# Altium footprint library Austindetz_CM4_Board_v1.0.PcbLib: 102 footprints (part 2 of 7)
Each footprint in its own frame and in the unit in brackets; x right, y up, seen from the top. Pads: shape width x height; smd on the part's side, far side on the other; paste and mask are expansions set on the pad; w line width, h text height; cw(c..) or ccw(c..) is an arc to the next point about the centre after c.
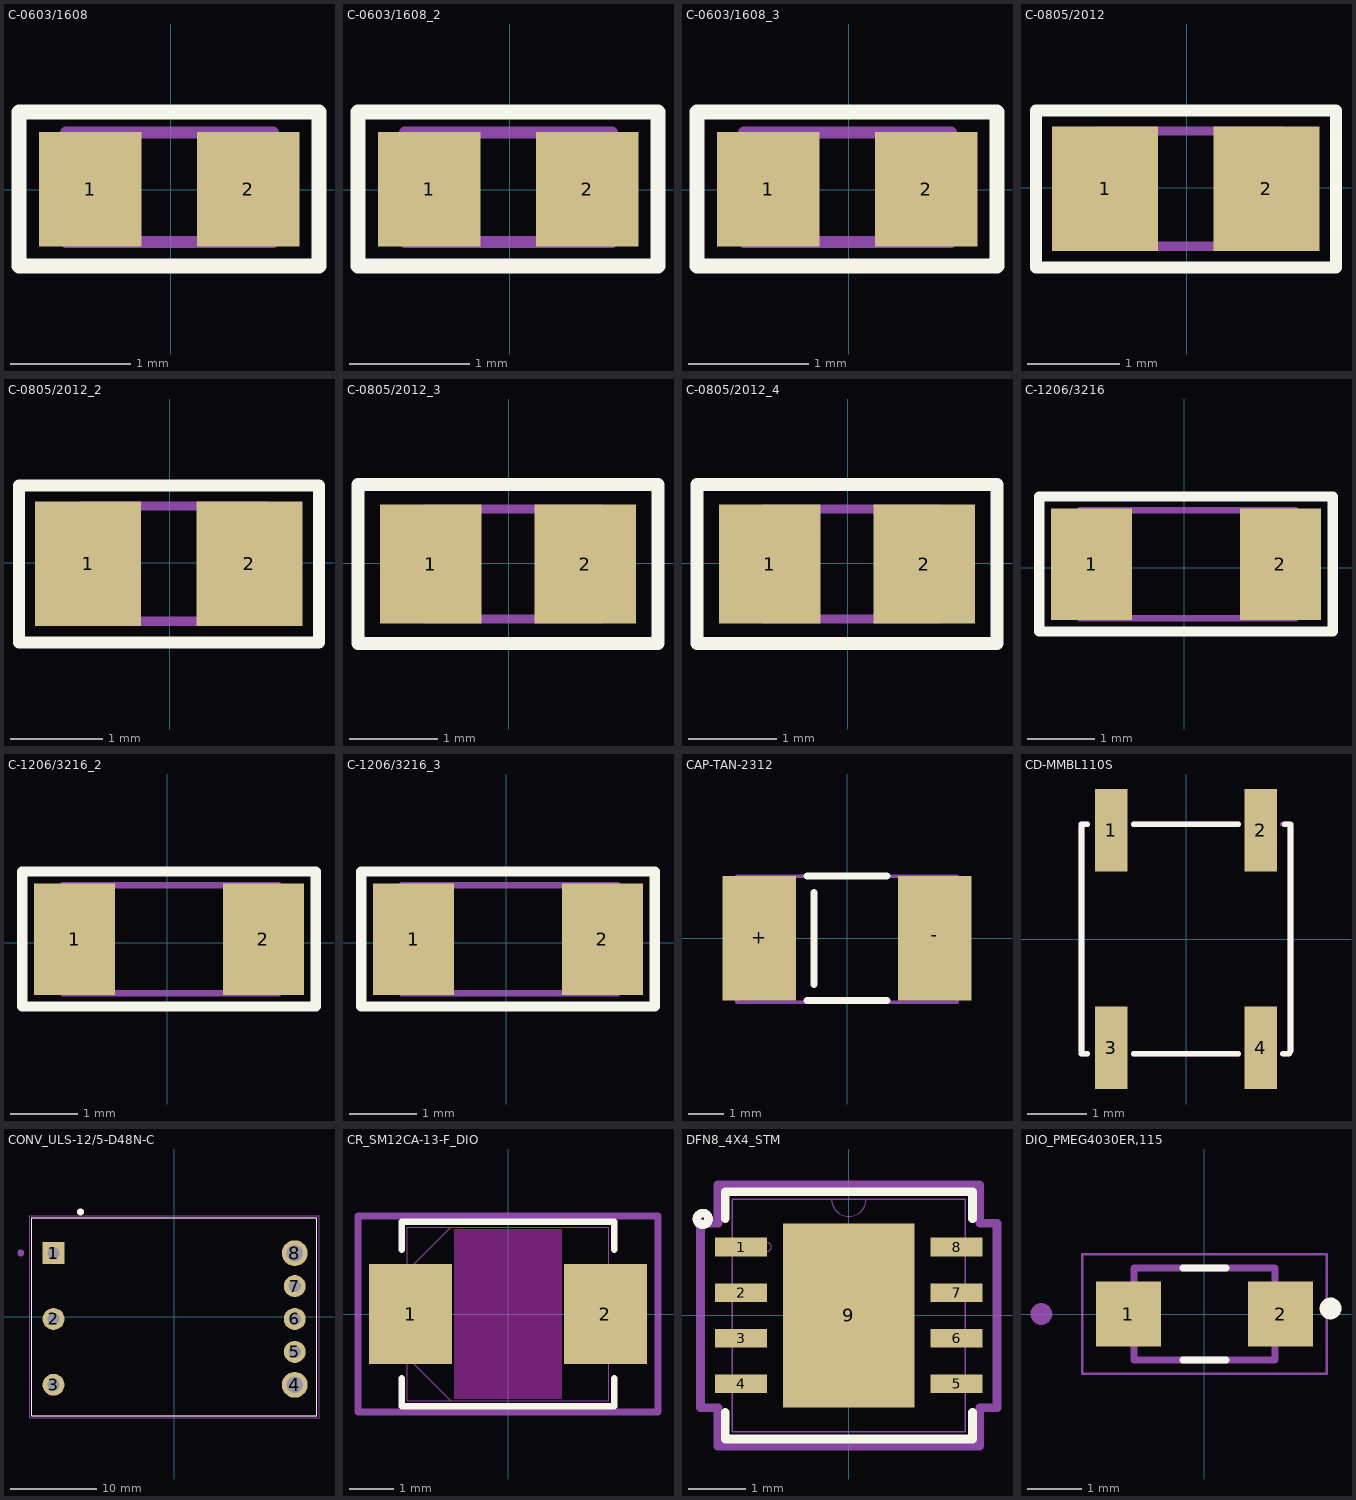
[diagram p1: the footprints below, top view; thin cyan lines are the x and y axes]

## C-0603/1608 [mm] "Chip Capacitor, 2-Leads, Body 1.60x0.80mm, IPC Medium Density"
height 0.89
pads (2):
  rect 0.85x0.95 smd: 1(-0.667,0.005) 2(0.643,0.005)
Top Overlay:
  lines w0.127: -1.258,-0.631 -1.258,0.645 1.23,0.645 1.23,-0.631 -1.258,-0.631
Top Assembly:
  lines w0.1: -0.868,-0.431 0.85,-0.431 0.85,0.475 -0.809,0.475 -0.868,0.475 -0.868,-0.431
  text "'.Designator'" at -3.12,-1.838 h1.27
3D body "0603 cap.STEP": height 0.82, standoff 0, extent -0.803,-0.402 0.797,0.422

## C-0603/1608_2 [mm]
pads (2):
  rect 0.85x0.95 smd: 1(-0.667,0.005) 2(0.643,0.005)
Top Overlay:
  lines w0.127: -1.258,-0.631 -1.258,0.645 1.23,0.645 1.23,-0.631 -1.258,-0.631
Top Assembly:
  lines w0.1: -0.868,-0.431 0.85,-0.431 0.85,0.475 -0.809,0.475 -0.868,0.475 -0.868,-0.431
  text "'.Designator'" at -3.12,-1.838 h1.27
3D body "0603 cap.STEP": height 0.82, standoff 0, extent -0.803,-0.402 0.797,0.422

## C-0603/1608_3 [mm]
pads (2):
  rect 0.85x0.95 smd: 1(-0.667,0.005) 2(0.643,0.005)
Top Overlay:
  lines w0.127: -1.258,-0.631 1.23,-0.631 1.23,0.645 -1.258,0.645 -1.258,-0.631
Top Assembly:
  lines w0.1: -0.868,-0.431 -0.868,0.475 -0.809,0.475 0.85,0.475 0.85,-0.431 -0.868,-0.431
  text "'.Designator'" at -3.12,-1.838 h1.27
3D body "0603 cap.STEP": height 0.82, standoff 0, extent -0.803,-0.402 0.797,0.422

## C-0805/2012 [mm] "Chip Capacitor, 2-Leads, Body 2.00x1.20mm, IPC Medium Density"
height 1.15
pads (2):
  rect 1.15x1.35 smd: 1(-0.883,-0.009) 2(0.867,-0.009)
Top Overlay:
  lines w0.127: -1.632,-0.864 1.621,-0.864 1.621,0.838 -1.632,0.838 -1.632,-0.633 -1.632,-0.864
Top Assembly:
  lines w0.1: -0.958,-0.634 -0.958,0.616 1.042,0.616 1.042,-0.634 -0.958,-0.634
  text "'.Designator'" at -2.987,-1.896 h1.27
3D body "0805 cap.STEP": height 1.26, standoff -0.02, extent -1.02,-0.644 0.98,0.63

## C-0805/2012_2 [mm]
pads (2):
  rect 1.15x1.35 smd: 1(-0.883,-0.009) 2(0.867,-0.009)
Top Overlay:
  lines w0.127: -1.632,-0.864 1.621,-0.864 1.621,0.838 -1.632,0.838 -1.632,-0.633 -1.632,-0.864
Top Assembly:
  lines w0.1: -0.958,-0.634 1.042,-0.634 1.042,0.616 -0.958,0.616 -0.958,-0.634
  text "'.Designator'" at -2.987,-1.896 h1.27
3D body "0805 cap.STEP": height 1.26, standoff -0.02, extent -1.02,-0.644 0.98,0.63

## C-0805/2012_3 [mm]
pads (2):
  rect 1.15x1.35 smd: 1(-0.883,-0.009) 2(0.867,-0.009)
Top Overlay:
  lines w0.15: -1.708,-0.909 1.692,-0.909 1.692,0.691 1.692,0.891 -1.708,0.891 -1.708,-0.709 -1.708,-0.909
Top Assembly:
  lines w0.1: -0.958,-0.634 1.042,-0.634 1.042,0.616 -0.958,0.616 -0.958,-0.634
  text "'.Designator'" at 1.067,-0.924 h1.27
3D body "0805 cap.STEP": height 1.26, standoff -0.02, extent -1.02,-0.644 0.98,0.63

## C-0805/2012_4 [mm]
pads (2):
  rect 1.15x1.35 smd: 1(-0.883,-0.009) 2(0.867,-0.009)
Top Overlay:
  lines w0.15: -1.708,-0.909 -1.708,-0.709 -1.708,0.891 1.692,0.891 1.692,0.691 1.692,-0.909 -1.708,-0.909
Top Assembly:
  lines w0.1: -0.958,-0.634 -0.958,0.616 1.042,0.616 1.042,-0.634 -0.958,-0.634
  text "'.Designator'" at 1.067,-0.924 h1.27
3D body "0805 cap.STEP": height 1.26, standoff -0.02, extent -1.02,-0.644 0.98,0.63

## C-1206/3216 [mm] "Chip Capacitor, 2-Leads, Body 3.25x1.60mm, IPC Medium Density"
height 1.6
pads (2):
  rect 1.2x1.65 smd: 1(-1.373,0.055) 2(1.427,0.055)
Top Overlay:
  lines w0.15: -2.15,-0.94 -2.15,0.714 -2.15,1.058 2.203,1.058 2.203,-0.94 -2.15,-0.94
Top Assembly:
  lines w0.1: -1.548,-0.745 -1.548,0.855 1.652,0.855 1.652,-0.745 -1.548,-0.745
  text "'.Designator'" at -3.2,1.45 h1.27
3D body "1206 cap.STEP": height 1.62, standoff 0, extent -1.59,-0.762 1.61,0.862

## C-1206/3216_2 [mm]
pads (2):
  rect 1.2x1.65 smd: 1(-1.373,0.055) 2(1.427,0.055)
Top Overlay:
  lines w0.15: -2.15,-0.94 2.203,-0.94 2.203,1.058 -2.15,1.058 -2.15,0.714 -2.15,-0.94
Top Assembly:
  lines w0.1: -1.548,-0.745 1.652,-0.745 1.652,0.855 -1.548,0.855 -1.548,-0.745
  text "'.Designator'" at -3.2,1.45 h1.27
3D body "1206 cap.STEP": height 1.62, standoff 0, extent -1.59,-0.762 1.61,0.862

## C-1206/3216_3 [mm]
pads (2):
  rect 1.2x1.65 smd: 1(-1.373,0.055) 2(1.427,0.055)
Top Overlay:
  lines w0.15: -2.15,-0.94 -2.15,0.714 -2.15,1.058 2.203,1.058 2.203,-0.94 -2.15,-0.94
Top Assembly:
  lines w0.1: -1.548,-0.745 -1.548,0.855 1.652,0.855 1.652,-0.745 -1.548,-0.745
  text "'.Designator'" at -3.2,1.45 h1.27
3D body "1206 cap.STEP": height 1.62, standoff 0, extent -1.59,-0.762 1.61,0.862

## CAP-TAN-2312 [mm]
pads (2):
  rect 2.07x3.51 smd: +(-2.471,0) -(2.471,0)
Top Overlay:
  lines w0.2: -1.12,-1.75 1.12,-1.75 ; -1.12,1.75 1.12,1.75 ; -0.932,-1.307 -0.932,1.293
Top Assembly:
  lines w0.1: -1.257,1.742 3.1,1.742 3.1,-1.8 -3.1,-1.8 -3.1,1.742 -1.2,1.742
  text "'.Designator'" at -3.022,-3.609 h1.27
3D body "t491c106m025at.stp": height 2.81, standoff 0.01, extent -3.126,-1.746 3.174,1.754

## CD-MMBL110S [mm]
pads (4):
  rect 0.55x1.4 smd: 1(-1.27,1.85) 2(1.27,1.85) 3(-1.27,-1.85) 4(1.27,-1.85)
Top Overlay:
  lines w0.1: -1.778,-1.95 -1.678,-1.95 ; -1.778,-1.905 -1.778,1.905 ; -1.778,1.95 -1.678,1.95 ; -0.889,-1.95 0.889,-1.95 ; -0.889,1.95 0.889,1.95 ; 1.651,-1.95 1.751,-1.95 ; 1.678,1.95 1.751,1.95 ; 1.778,-1.905 1.778,1.95
Top 3D Body:
  lines w0.1: -1.778,-1.95 -1.678,-1.95 ; -1.778,-1.905 -1.778,1.905 ; -1.778,1.95 -1.678,1.95 ; -0.889,-1.95 0.889,-1.95 ; -0.889,1.95 0.889,1.95 ; 1.651,-1.95 1.751,-1.95 ; 1.651,1.95 1.751,1.95 ; 1.778,-1.905 1.778,1.905

## CONV_ULS-12/5-D48N-C [mm]
pads (8):
  rect 2.54x2.54 hole 1.4: 1(-14,7.37)
  round 2.54 hole 1.4: 2(-14,-0.25) 3(-14,-7.87) 5(13.94,-4.06) 6(13.94,-0.25) 7(13.94,3.56)
  round 3 hole 1.956: 4(13.94,-7.87) 8(13.94,7.37)
Top Overlay:
  circle w0.4: c-10.873,12.157 r0.2
  lines w0.127: -16.5,-11.45 16.5,-11.45 16.5,11.45 -16.5,11.45 -16.5,-11.45
Mechanical 13:
  circle w0.4: c-17.8,7.4 r0.2
  lines w0.127: -16.5,-11.45 16.5,-11.45 16.5,11.45 -16.5,11.45 -16.5,-11.45
Mechanical 15:
  lines w0.05: -16.75,-11.7 16.75,-11.7 16.75,11.7 -16.75,11.7 -16.75,-11.7
3D body "mps_dcdc_uls_3_3_20_thd_a.step": height 4.15, standoff -10.18, extent -16.475,-11.415 16.545,11.445

## CR_SM12CA-13-F_DIO [mil]
height 130.31
pads (2):
  rect 74x89 smd paste+0 mask+0: 1(-87,0) 2(87,0)
Top Layer keep-out:
  region: -48,-75.5 -48,75.5 48,75.5 48,-75.5
Top Overlay:
  lines w6: -95,-57.6 -95,-82.5 95,-82.5 95,-57.6 ; -95,57.6 -95,82.5 95,82.5 95,57.6
Keep-Out Layer:
  region: -48,-75.5 -48,75.5 48,75.5 48,-75.5
Mechanical 13:
  lines w1: -90,-38.75 -51.25,-77.5 ; -90,38.75 -51.25,77.5 ; -110,-43.5 -110,43.5 -90,43.5 -90,-43.5 -110,-43.5 ; -90,-77.5 90,-77.5 90,77.5 -90,77.5 -90,-77.5 ; 90,-43.5 90,43.5 110,43.5 110,-43.5 90,-43.5
Mechanical 15:
  lines w6: -134,-87.5 -134,87.5 134,87.5 134,-87.5 -134,-87.5

## DFN8_4X4_STM [mil]
height 62.99
pads (9):
  rect 36x13 smd: 1(-74.5,47.24) 2(-74.5,15.75) 3(-74.5,-15.75) 4(-74.5,-47.24) 5(74.5,-47.24) 6(74.5,-15.75) 7(74.5,15.75) 8(74.5,47.24)
  rect 91x127 smd: 9(0,0)
Top Overlay:
  circle w6: c-100.98,66.75 r4
  lines w6: -85.5,-66.84 -85.5,-85.5 85.5,-85.5 85.5,-66.84 ; -85.5,66.84 -85.5,85.5 85.5,85.5 85.5,66.84
Top Paste:
  region: 41.56,-3.94 -41.56,-3.94 -41.56,-59.56 41.56,-59.56
  region: 41.56,59.56 -41.56,59.56 -41.56,3.94 41.56,3.94
Mechanical 13:
  circle w0: c-56.5,47.24 r3
  lines w0: -12,80.5 ccw(c0,80.5) 12,80.5
  lines w1: -80.5,-80.5 -80.5,80.5 80.5,80.5 80.5,-80.5 -80.5,-80.5
Mechanical 15:
  lines w6: -102.5,-63.74 -90.5,-63.74 -90.5,-90.5 90.5,-90.5 90.5,-63.74 102.5,-63.74 102.5,63.74 90.5,63.74 90.5,90.5 -90.5,90.5 -90.5,63.74 -102.5,63.74 -102.5,-63.74
3D body "DFN8_4X4_STM.step": height 39.09, standoff 0, extent -80.51,-80.51 80.51,80.51

## DIO_PMEG4030ER,115 [mm]
pads (2):
  rect 1.2x1.2 smd paste-0.05: 1(-1.4,0) 2(1.4,0)
Top Overlay:
  circle w0.2: c2.32,0.101 r0.1
  lines w0.127: -0.4,-0.85 0.4,-0.85 ; -0.4,0.85 0.4,0.85
Mechanical 13:
  circle w0.2: c-3,0 r0.1
  lines w0.127: -1.3,-0.85 -1.3,0.85 1.3,0.85 1.3,-0.85 -1.3,-0.85
Mechanical 15:
  lines w0.05: -2.25,-1.1 2.25,-1.1 2.25,1.1 -2.25,1.1 -2.25,-1.1
3D body "step_temp.STEP": height 1.1, standoff 0, extent -1.75,-0.85 1.75,0.85